# Altium schematic symbol library jlcpcb_2025_04_capacitors_extended_0603.schlib: 3668 symbols (part 9 of 20) (continued)
## CC0603JRNPO9BN152
designator C?  Capacitance: 1.5nF  (hidden comment: *)
Capacitor, Ceramic (MLCC), 1.5nF, ±5%, 50V, NP0, ±5%, SMD 0603; Manufacturer: YAGEO; Manufacturer Part Number: CC0603JRNPO9BN152; Package Size: 0603; JLCPCB Basic Part: No; JLCPCB Part Number: C107039; Supplier 1: LCSC; Category: Capacitors - MLCC; Supplier Part Number 1: C107039; Tolerance: ±5%; Voltage Rating: 50V; Temperature Coefficient: NP0; RoHS: Yes; ComponentLink1Description: Datasheet; ComponentLink1URL: https://wmsc.lcsc.com/wmsc/upload/file/pdf/v2/lcsc/2304140030_YAGEO-CC0603JRNPO9BN152_C107039.pdf; ComponentLink2Description: JLCPCB Part URL; ComponentLink2URL: https://jlcpcb.com/partdetail/C107039; ComponentLink3Description: LCSC Part URL; ComponentLink3URL: https://lcsc.com/product-detail/Multilayer-Ceramic-Capacitors-MLCC---SMD-SMT_YAGEO-YAGEO-CC0603JRNPO9BN152_C107039.html
footprint CAP-0603 (0603 (1608M) Capacitor)
pins: 1, 2

## CC0603JRNPO9BN160
designator C?  Capacitance: 16pF  (hidden comment: *)
Capacitor, Ceramic (MLCC), 16pF, ±5%, 50V, NP0, ±5%, SMD 0603; Manufacturer: YAGEO; Manufacturer Part Number: CC0603JRNPO9BN160; Package Size: 0603; JLCPCB Basic Part: No; JLCPCB Part Number: C327125; Supplier 1: LCSC; Category: Capacitors - MLCC; Supplier Part Number 1: C327125; Tolerance: ±5%; Voltage Rating: 50V; Temperature Coefficient: NP0; RoHS: Yes; ComponentLink1Description: Datasheet; ComponentLink1URL: https://wmsc.lcsc.com/wmsc/upload/file/pdf/v2/lcsc/1811141233_YAGEO-CC0603JRNPO9BN160_C327125.pdf; ComponentLink2Description: JLCPCB Part URL; ComponentLink2URL: https://jlcpcb.com/partdetail/C327125; ComponentLink3Description: LCSC Part URL; ComponentLink3URL: https://lcsc.com/product-detail/Multilayer-Ceramic-Capacitors-MLCC---SMD-SMT_YAGEO-YAGEO-CC0603JRNPO9BN160_C327125.html
footprint CAP-0603 (0603 (1608M) Capacitor)
pins: 1, 2

## CC0603JRNPO9BN161
designator C?  Capacitance: 160pF  (hidden comment: *)
Capacitor, Ceramic (MLCC), 160pF, ±5%, 50V, NP0, ±5%, SMD 0603; Manufacturer: YAGEO; Manufacturer Part Number: CC0603JRNPO9BN161; Package Size: 0603; JLCPCB Basic Part: No; JLCPCB Part Number: C327274; Supplier 1: LCSC; Category: Capacitors - MLCC; Supplier Part Number 1: C327274; Tolerance: ±5%; Voltage Rating: 50V; Temperature Coefficient: NP0; RoHS: Yes; ComponentLink1Description: Datasheet; ComponentLink1URL: https://wmsc.lcsc.com/wmsc/upload/file/pdf/v2/lcsc/2304140030_YAGEO-CC0603JRNPO9BN161_C327274.pdf; ComponentLink2Description: JLCPCB Part URL; ComponentLink2URL: https://jlcpcb.com/partdetail/C327274; ComponentLink3Description: LCSC Part URL; ComponentLink3URL: https://lcsc.com/product-detail/Multilayer-Ceramic-Capacitors-MLCC---SMD-SMT_YAGEO-YAGEO-CC0603JRNPO9BN161_C327274.html
footprint CAP-0603 (0603 (1608M) Capacitor)
pins: 1, 2

## CC0603JRNPO9BN180
designator C?  Capacitance: 18pF  (hidden comment: *)
Capacitor, Ceramic (MLCC), 18pF, ±5%, 50V, NP0, ±5%, SMD 0603; Manufacturer: YAGEO; Manufacturer Part Number: CC0603JRNPO9BN180; Package Size: 0603; JLCPCB Basic Part: No; JLCPCB Part Number: C107040; Supplier 1: LCSC; Category: Capacitors - MLCC; Supplier Part Number 1: C107040; Tolerance: ±5%; Voltage Rating: 50V; Temperature Coefficient: NP0; RoHS: Yes; ComponentLink1Description: Datasheet; ComponentLink1URL: https://wmsc.lcsc.com/wmsc/upload/file/pdf/v2/lcsc/2304140030_YAGEO-CC0603JRNPO9BN180_C107040.pdf; ComponentLink2Description: JLCPCB Part URL; ComponentLink2URL: https://jlcpcb.com/partdetail/C107040; ComponentLink3Description: LCSC Part URL; ComponentLink3URL: https://lcsc.com/product-detail/Multilayer-Ceramic-Capacitors-MLCC---SMD-SMT_YAGEO-YAGEO-CC0603JRNPO9BN180_C107040.html
footprint CAP-0603 (0603 (1608M) Capacitor)
pins: 1, 2

## CC0603JRNPO9BN181
designator C?  Capacitance: 180pF  (hidden comment: *)
Capacitor, Ceramic (MLCC), 180pF, ±5%, 50V, NP0, ±5%, SMD 0603; Manufacturer: YAGEO; Manufacturer Part Number: CC0603JRNPO9BN181; Package Size: 0603; JLCPCB Basic Part: No; JLCPCB Part Number: C107041; Supplier 1: LCSC; Category: Capacitors - MLCC; Supplier Part Number 1: C107041; Tolerance: ±5%; Voltage Rating: 50V; Temperature Coefficient: NP0; RoHS: Yes; ComponentLink1Description: Datasheet; ComponentLink1URL: https://wmsc.lcsc.com/wmsc/upload/file/pdf/v2/lcsc/2304140030_YAGEO-CC0603JRNPO9BN181_C107041.pdf; ComponentLink2Description: JLCPCB Part URL; ComponentLink2URL: https://jlcpcb.com/partdetail/C107041; ComponentLink3Description: LCSC Part URL; ComponentLink3URL: https://lcsc.com/product-detail/Multilayer-Ceramic-Capacitors-MLCC---SMD-SMT_YAGEO-YAGEO-CC0603JRNPO9BN181_C107041.html
footprint CAP-0603 (0603 (1608M) Capacitor)
pins: 1, 2

## CC0603JRNPO9BN182
designator C?  Capacitance: 1.8nF  (hidden comment: *)
Capacitor, Ceramic (MLCC), 1.8nF, ±5%, 50V, NP0, ±5%, SMD 0603; Manufacturer: YAGEO; Manufacturer Part Number: CC0603JRNPO9BN182; Package Size: 0603; JLCPCB Basic Part: No; JLCPCB Part Number: C107042; Supplier 1: LCSC; Category: Capacitors - MLCC; Supplier Part Number 1: C107042; Tolerance: ±5%; Voltage Rating: 50V; Temperature Coefficient: NP0; RoHS: Yes; ComponentLink1Description: Datasheet; ComponentLink1URL: https://wmsc.lcsc.com/wmsc/upload/file/pdf/v2/lcsc/2304140030_YAGEO-CC0603JRNPO9BN182_C107042.pdf; ComponentLink2Description: JLCPCB Part URL; ComponentLink2URL: https://jlcpcb.com/partdetail/C107042; ComponentLink3Description: LCSC Part URL; ComponentLink3URL: https://lcsc.com/product-detail/Multilayer-Ceramic-Capacitors-MLCC---SMD-SMT_YAGEO-YAGEO-CC0603JRNPO9BN182_C107042.html
footprint CAP-0603 (0603 (1608M) Capacitor)
pins: 1, 2

## CC0603JRNPO9BN200
designator C?  Capacitance: 20pF  (hidden comment: *)
Capacitor, Ceramic (MLCC), 20pF, ±5%, 50V, NP0, ±5%, SMD 0603; Manufacturer: YAGEO; Manufacturer Part Number: CC0603JRNPO9BN200; Package Size: 0603; JLCPCB Basic Part: No; JLCPCB Part Number: C105621; Supplier 1: LCSC; Category: Capacitors - MLCC; Supplier Part Number 1: C105621; Tolerance: ±5%; Voltage Rating: 50V; Temperature Coefficient: NP0; RoHS: Yes; ComponentLink1Description: Datasheet; ComponentLink1URL: https://wmsc.lcsc.com/wmsc/upload/file/pdf/v2/lcsc/2304140030_YAGEO-CC0603JRNPO9BN200_C105621.pdf; ComponentLink2Description: JLCPCB Part URL; ComponentLink2URL: https://jlcpcb.com/partdetail/C105621; ComponentLink3Description: LCSC Part URL; ComponentLink3URL: https://lcsc.com/product-detail/Multilayer-Ceramic-Capacitors-MLCC---SMD-SMT_YAGEO-YAGEO-CC0603JRNPO9BN200_C105621.html
footprint CAP-0603 (0603 (1608M) Capacitor)
pins: 1, 2

## CC0603JRNPO9BN201
designator C?  Capacitance: 200pF  (hidden comment: *)
Capacitor, Ceramic (MLCC), 200pF, ±5%, 50V, NP0, ±5%, SMD 0603; Manufacturer: YAGEO; Manufacturer Part Number: CC0603JRNPO9BN201; Package Size: 0603; JLCPCB Basic Part: No; JLCPCB Part Number: C113796; Supplier 1: LCSC; Category: Capacitors - MLCC; Supplier Part Number 1: C113796; Tolerance: ±5%; Voltage Rating: 50V; Temperature Coefficient: NP0; RoHS: Yes; ComponentLink1Description: Datasheet; ComponentLink1URL: https://wmsc.lcsc.com/wmsc/upload/file/pdf/v2/lcsc/2304140030_YAGEO-CC0603JRNPO9BN201_C113796.pdf; ComponentLink2Description: JLCPCB Part URL; ComponentLink2URL: https://jlcpcb.com/partdetail/C113796; ComponentLink3Description: LCSC Part URL; ComponentLink3URL: https://lcsc.com/product-detail/Multilayer-Ceramic-Capacitors-MLCC---SMD-SMT_YAGEO-YAGEO-CC0603JRNPO9BN201_C113796.html
footprint CAP-0603 (0603 (1608M) Capacitor)
pins: 1, 2

## CC0603JRNPO9BN220
designator C?  Capacitance: 22pF  (hidden comment: *)
Capacitor, Ceramic (MLCC), 22pF, ±5%, 50V, NP0, ±5%, SMD 0603; Manufacturer: YAGEO; Manufacturer Part Number: CC0603JRNPO9BN220; Package Size: 0603; JLCPCB Basic Part: No; JLCPCB Part Number: C105620; Supplier 1: LCSC; Category: Capacitors - MLCC; Supplier Part Number 1: C105620; Tolerance: ±5%; Voltage Rating: 50V; Temperature Coefficient: NP0; RoHS: Yes; ComponentLink1Description: Datasheet; ComponentLink1URL: https://wmsc.lcsc.com/wmsc/upload/file/pdf/v2/lcsc/2304140030_YAGEO-CC0603JRNPO9BN220_C105620.pdf; ComponentLink2Description: JLCPCB Part URL; ComponentLink2URL: https://jlcpcb.com/partdetail/C105620; ComponentLink3Description: LCSC Part URL; ComponentLink3URL: https://lcsc.com/product-detail/Multilayer-Ceramic-Capacitors-MLCC---SMD-SMT_YAGEO-YAGEO-CC0603JRNPO9BN220_C105620.html
footprint CAP-0603 (0603 (1608M) Capacitor)
pins: 1, 2

## CC0603JRNPO9BN221
designator C?  Capacitance: 220pF  (hidden comment: *)
Capacitor, Ceramic (MLCC), 220pF, ±5%, 50V, NP0, ±5%, SMD 0603; Manufacturer: YAGEO; Manufacturer Part Number: CC0603JRNPO9BN221; Package Size: 0603; JLCPCB Basic Part: No; JLCPCB Part Number: C106210; Supplier 1: LCSC; Category: Capacitors - MLCC; Supplier Part Number 1: C106210; Tolerance: ±5%; Voltage Rating: 50V; Temperature Coefficient: NP0; RoHS: Yes; ComponentLink1Description: Datasheet; ComponentLink1URL: https://wmsc.lcsc.com/wmsc/upload/file/pdf/v2/lcsc/2304140030_YAGEO-CC0603JRNPO9BN221_C106210.pdf; ComponentLink2Description: JLCPCB Part URL; ComponentLink2URL: https://jlcpcb.com/partdetail/C106210; ComponentLink3Description: LCSC Part URL; ComponentLink3URL: https://lcsc.com/product-detail/Multilayer-Ceramic-Capacitors-MLCC---SMD-SMT_YAGEO-YAGEO-CC0603JRNPO9BN221_C106210.html
footprint CAP-0603 (0603 (1608M) Capacitor)
pins: 1, 2

## CC0603JRNPO9BN222
designator C?  Capacitance: 2.2nF  (hidden comment: *)
Capacitor, Ceramic (MLCC), 2.2nF, ±5%, 50V, NP0, ±5%, SMD 0603; Manufacturer: YAGEO; Manufacturer Part Number: CC0603JRNPO9BN222; Package Size: 0603; JLCPCB Basic Part: No; JLCPCB Part Number: C107043; Supplier 1: LCSC; Category: Capacitors - MLCC; Supplier Part Number 1: C107043; Tolerance: ±5%; Voltage Rating: 50V; Temperature Coefficient: NP0; RoHS: Yes; ComponentLink1Description: Datasheet; ComponentLink1URL: https://wmsc.lcsc.com/wmsc/upload/file/pdf/v2/lcsc/2304140030_YAGEO-CC0603JRNPO9BN222_C107043.pdf; ComponentLink2Description: JLCPCB Part URL; ComponentLink2URL: https://jlcpcb.com/partdetail/C107043; ComponentLink3Description: LCSC Part URL; ComponentLink3URL: https://lcsc.com/product-detail/Multilayer-Ceramic-Capacitors-MLCC---SMD-SMT_YAGEO-YAGEO-CC0603JRNPO9BN222_C107043.html
footprint CAP-0603 (0603 (1608M) Capacitor)
pins: 1, 2

## CC0603JRNPO9BN240
designator C?  Capacitance: 24pF  (hidden comment: *)
Capacitor, Ceramic (MLCC), 24pF, ±5%, 50V, NP0, ±5%, SMD 0603; Manufacturer: YAGEO; Manufacturer Part Number: CC0603JRNPO9BN240; Package Size: 0603; JLCPCB Basic Part: No; JLCPCB Part Number: C107044; Supplier 1: LCSC; Category: Capacitors - MLCC; Supplier Part Number 1: C107044; Tolerance: ±5%; Voltage Rating: 50V; Temperature Coefficient: NP0; RoHS: Yes; ComponentLink1Description: Datasheet; ComponentLink1URL: https://wmsc.lcsc.com/wmsc/upload/file/pdf/v2/lcsc/2304140030_YAGEO-CC0603JRNPO9BN240_C107044.pdf; ComponentLink2Description: JLCPCB Part URL; ComponentLink2URL: https://jlcpcb.com/partdetail/C107044; ComponentLink3Description: LCSC Part URL; ComponentLink3URL: https://lcsc.com/product-detail/Multilayer-Ceramic-Capacitors-MLCC---SMD-SMT_YAGEO-YAGEO-CC0603JRNPO9BN240_C107044.html
footprint CAP-0603 (0603 (1608M) Capacitor)
pins: 1, 2

## CC0603JRNPO9BN241
designator C?  Capacitance: 240pF  (hidden comment: *)
Capacitor, Ceramic (MLCC), 240pF, ±5%, 50V, NP0, ±5%, SMD 0603; Manufacturer: YAGEO; Manufacturer Part Number: CC0603JRNPO9BN241; Package Size: 0603; JLCPCB Basic Part: No; JLCPCB Part Number: C519400; Supplier 1: LCSC; Category: Capacitors - MLCC; Supplier Part Number 1: C519400; Tolerance: ±5%; Voltage Rating: 50V; Temperature Coefficient: NP0; RoHS: Yes; ComponentLink1Description: Datasheet; ComponentLink1URL: https://wmsc.lcsc.com/wmsc/upload/file/pdf/v2/lcsc/2005181834_YAGEO-CC0603JRNPO9BN241_C519400.pdf; ComponentLink2Description: JLCPCB Part URL; ComponentLink2URL: https://jlcpcb.com/partdetail/C519400; ComponentLink3Description: LCSC Part URL; ComponentLink3URL: https://lcsc.com/product-detail/Multilayer-Ceramic-Capacitors-MLCC---SMD-SMT_YAGEO-YAGEO-CC0603JRNPO9BN241_C519400.html
footprint CAP-0603 (0603 (1608M) Capacitor)
pins: 1, 2

## CC0603JRNPO9BN250
designator C?  Capacitance: 25pF  (hidden comment: *)
Capacitor, Ceramic (MLCC), 25pF, ±5%, 50V, NP0, ±5%, SMD 0603; Manufacturer: YAGEO; Manufacturer Part Number: CC0603JRNPO9BN250; Package Size: 0603; JLCPCB Basic Part: No; JLCPCB Part Number: C282067; Supplier 1: LCSC; Category: Capacitors - MLCC; Supplier Part Number 1: C282067; Tolerance: ±5%; Voltage Rating: 50V; Temperature Coefficient: NP0; RoHS: Yes; ComponentLink1Description: Datasheet; ComponentLink1URL: https://wmsc.lcsc.com/wmsc/upload/file/pdf/v2/lcsc/2304140030_YAGEO-CC0603JRNPO9BN250_C282067.pdf; ComponentLink2Description: JLCPCB Part URL; ComponentLink2URL: https://jlcpcb.com/partdetail/C282067; ComponentLink3Description: LCSC Part URL; ComponentLink3URL: https://lcsc.com/product-detail/Multilayer-Ceramic-Capacitors-MLCC---SMD-SMT_YAGEO-YAGEO-CC0603JRNPO9BN250_C282067.html
footprint CAP-0603 (0603 (1608M) Capacitor)
pins: 1, 2

## CC0603JRNPO9BN270
designator C?  Capacitance: 27pF  (hidden comment: *)
Capacitor, Ceramic (MLCC), 27pF, ±5%, 50V, NP0, ±5%, SMD 0603; Manufacturer: YAGEO; Manufacturer Part Number: CC0603JRNPO9BN270; Package Size: 0603; JLCPCB Basic Part: No; JLCPCB Part Number: C107045; Supplier 1: LCSC; Category: Capacitors - MLCC; Supplier Part Number 1: C107045; Tolerance: ±5%; Voltage Rating: 50V; Temperature Coefficient: NP0; RoHS: Yes; ComponentLink1Description: Datasheet; ComponentLink1URL: https://wmsc.lcsc.com/wmsc/upload/file/pdf/v2/lcsc/2304140030_YAGEO-CC0603JRNPO9BN270_C107045.pdf; ComponentLink2Description: JLCPCB Part URL; ComponentLink2URL: https://jlcpcb.com/partdetail/C107045; ComponentLink3Description: LCSC Part URL; ComponentLink3URL: https://lcsc.com/product-detail/Multilayer-Ceramic-Capacitors-MLCC---SMD-SMT_YAGEO-YAGEO-CC0603JRNPO9BN270_C107045.html
footprint CAP-0603 (0603 (1608M) Capacitor)
pins: 1, 2

## CC0603JRNPO9BN271
designator C?  Capacitance: 270pF  (hidden comment: *)
Capacitor, Ceramic (MLCC), 270pF, ±5%, 50V, NP0, ±5%, SMD 0603; Manufacturer: YAGEO; Manufacturer Part Number: CC0603JRNPO9BN271; Package Size: 0603; JLCPCB Basic Part: No; JLCPCB Part Number: C107046; Supplier 1: LCSC; Category: Capacitors - MLCC; Supplier Part Number 1: C107046; Tolerance: ±5%; Voltage Rating: 50V; Temperature Coefficient: NP0; RoHS: Yes; ComponentLink1Description: Datasheet; ComponentLink1URL: https://wmsc.lcsc.com/wmsc/upload/file/pdf/v2/lcsc/2304140030_YAGEO-CC0603JRNPO9BN271_C107046.pdf; ComponentLink2Description: JLCPCB Part URL; ComponentLink2URL: https://jlcpcb.com/partdetail/C107046; ComponentLink3Description: LCSC Part URL; ComponentLink3URL: https://lcsc.com/product-detail/Multilayer-Ceramic-Capacitors-MLCC---SMD-SMT_YAGEO-YAGEO-CC0603JRNPO9BN271_C107046.html
footprint CAP-0603 (0603 (1608M) Capacitor)
pins: 1, 2

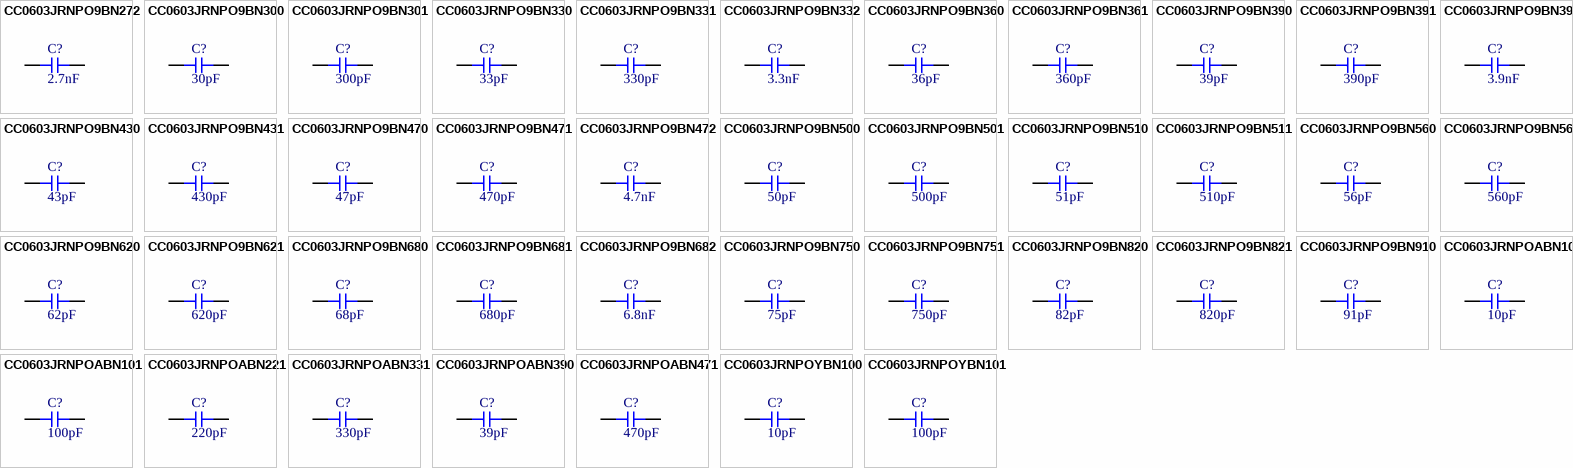
[diagram p41: symbols CC0603JRNPO9BN272 to CC0603JRNPOYBN101]

## CC0603JRNPO9BN272
designator C?  Capacitance: 2.7nF  (hidden comment: *)
Capacitor, Ceramic (MLCC), 2.7nF, ±5%, 50V, NP0, ±5%, SMD 0603; Manufacturer: YAGEO; Manufacturer Part Number: CC0603JRNPO9BN272; Package Size: 0603; JLCPCB Basic Part: No; JLCPCB Part Number: C326759; Supplier 1: LCSC; Category: Capacitors - MLCC; Supplier Part Number 1: C326759; Tolerance: ±5%; Voltage Rating: 50V; Temperature Coefficient: NP0; RoHS: Yes; ComponentLink1Description: Datasheet; ComponentLink1URL: https://wmsc.lcsc.com/wmsc/upload/file/pdf/v2/lcsc/1811151646_YAGEO-CC0603JRNPO9BN272_C326759.pdf; ComponentLink2Description: JLCPCB Part URL; ComponentLink2URL: https://jlcpcb.com/partdetail/C326759; ComponentLink3Description: LCSC Part URL; ComponentLink3URL: https://lcsc.com/product-detail/Multilayer-Ceramic-Capacitors-MLCC---SMD-SMT_YAGEO-YAGEO-CC0603JRNPO9BN272_C326759.html
footprint CAP-0603 (0603 (1608M) Capacitor)
pins: 1, 2

## CC0603JRNPO9BN300
designator C?  Capacitance: 30pF  (hidden comment: *)
Capacitor, Ceramic (MLCC), 30pF, ±5%, 50V, NP0, ±5%, SMD 0603; Manufacturer: YAGEO; Manufacturer Part Number: CC0603JRNPO9BN300; Package Size: 0603; JLCPCB Basic Part: No; JLCPCB Part Number: C113797; Supplier 1: LCSC; Category: Capacitors - MLCC; Supplier Part Number 1: C113797; Tolerance: ±5%; Voltage Rating: 50V; Temperature Coefficient: NP0; RoHS: Yes; ComponentLink1Description: Datasheet; ComponentLink1URL: https://wmsc.lcsc.com/wmsc/upload/file/pdf/v2/lcsc/2304140030_YAGEO-CC0603JRNPO9BN300_C113797.pdf; ComponentLink2Description: JLCPCB Part URL; ComponentLink2URL: https://jlcpcb.com/partdetail/C113797; ComponentLink3Description: LCSC Part URL; ComponentLink3URL: https://lcsc.com/product-detail/Multilayer-Ceramic-Capacitors-MLCC---SMD-SMT_YAGEO-YAGEO-CC0603JRNPO9BN300_C113797.html
footprint CAP-0603 (0603 (1608M) Capacitor)
pins: 1, 2

## CC0603JRNPO9BN301
designator C?  Capacitance: 300pF  (hidden comment: *)
Capacitor, Ceramic (MLCC), 300pF, ±5%, 50V, NP0, ±5%, SMD 0603; Manufacturer: YAGEO; Manufacturer Part Number: CC0603JRNPO9BN301; Package Size: 0603; JLCPCB Basic Part: No; JLCPCB Part Number: C519401; Supplier 1: LCSC; Category: Capacitors - MLCC; Supplier Part Number 1: C519401; Tolerance: ±5%; Voltage Rating: 50V; Temperature Coefficient: NP0; RoHS: Yes; ComponentLink1Description: Datasheet; ComponentLink1URL: https://wmsc.lcsc.com/wmsc/upload/file/pdf/v2/lcsc/2005141203_YAGEO-CC0603JRNPO9BN301_C519401.pdf; ComponentLink2Description: JLCPCB Part URL; ComponentLink2URL: https://jlcpcb.com/partdetail/C519401; ComponentLink3Description: LCSC Part URL; ComponentLink3URL: https://lcsc.com/product-detail/Multilayer-Ceramic-Capacitors-MLCC---SMD-SMT_YAGEO-YAGEO-CC0603JRNPO9BN301_C519401.html
footprint CAP-0603 (0603 (1608M) Capacitor)
pins: 1, 2

## CC0603JRNPO9BN330
designator C?  Capacitance: 33pF  (hidden comment: *)
Capacitor, Ceramic (MLCC), 33pF, ±5%, 50V, NP0, ±5%, SMD 0603; Manufacturer: YAGEO; Manufacturer Part Number: CC0603JRNPO9BN330; Package Size: 0603; JLCPCB Basic Part: No; JLCPCB Part Number: C107047; Supplier 1: LCSC; Category: Capacitors - MLCC; Supplier Part Number 1: C107047; Tolerance: ±5%; Voltage Rating: 50V; Temperature Coefficient: NP0; RoHS: Yes; ComponentLink1Description: Datasheet; ComponentLink1URL: https://wmsc.lcsc.com/wmsc/upload/file/pdf/v2/lcsc/2304140030_YAGEO-CC0603JRNPO9BN330_C107047.pdf; ComponentLink2Description: JLCPCB Part URL; ComponentLink2URL: https://jlcpcb.com/partdetail/C107047; ComponentLink3Description: LCSC Part URL; ComponentLink3URL: https://lcsc.com/product-detail/Multilayer-Ceramic-Capacitors-MLCC---SMD-SMT_YAGEO-YAGEO-CC0603JRNPO9BN330_C107047.html
footprint CAP-0603 (0603 (1608M) Capacitor)
pins: 1, 2

## CC0603JRNPO9BN331
designator C?  Capacitance: 330pF  (hidden comment: *)
Capacitor, Ceramic (MLCC), 330pF, ±5%, 50V, NP0, ±5%, SMD 0603; Manufacturer: YAGEO; Manufacturer Part Number: CC0603JRNPO9BN331; Package Size: 0603; JLCPCB Basic Part: No; JLCPCB Part Number: C62784; Supplier 1: LCSC; Category: Capacitors - MLCC; Supplier Part Number 1: C62784; Tolerance: ±5%; Voltage Rating: 50V; Temperature Coefficient: NP0; RoHS: Yes; ComponentLink1Description: Datasheet; ComponentLink1URL: https://wmsc.lcsc.com/wmsc/upload/file/pdf/v2/lcsc/2304140030_YAGEO-CC0603JRNPO9BN331_C62784.pdf; ComponentLink2Description: JLCPCB Part URL; ComponentLink2URL: https://jlcpcb.com/partdetail/C62784; ComponentLink3Description: LCSC Part URL; ComponentLink3URL: https://lcsc.com/product-detail/Multilayer-Ceramic-Capacitors-MLCC---SMD-SMT_YAGEO-YAGEO-CC0603JRNPO9BN331_C62784.html
footprint CAP-0603 (0603 (1608M) Capacitor)
pins: 1, 2

## CC0603JRNPO9BN332
designator C?  Capacitance: 3.3nF  (hidden comment: *)
Capacitor, Ceramic (MLCC), 3.3nF, ±5%, 50V, NP0, ±5%, SMD 0603; Manufacturer: YAGEO; Manufacturer Part Number: CC0603JRNPO9BN332; Package Size: 0603; JLCPCB Basic Part: No; JLCPCB Part Number: C107048; Supplier 1: LCSC; Category: Capacitors - MLCC; Supplier Part Number 1: C107048; Tolerance: ±5%; Voltage Rating: 50V; Temperature Coefficient: NP0; RoHS: Yes; ComponentLink1Description: Datasheet; ComponentLink1URL: https://wmsc.lcsc.com/wmsc/upload/file/pdf/v2/lcsc/2304140030_YAGEO-CC0603JRNPO9BN332_C107048.pdf; ComponentLink2Description: JLCPCB Part URL; ComponentLink2URL: https://jlcpcb.com/partdetail/C107048; ComponentLink3Description: LCSC Part URL; ComponentLink3URL: https://lcsc.com/product-detail/Multilayer-Ceramic-Capacitors-MLCC---SMD-SMT_YAGEO-YAGEO-CC0603JRNPO9BN332_C107048.html
footprint CAP-0603 (0603 (1608M) Capacitor)
pins: 1, 2

## CC0603JRNPO9BN360
designator C?  Capacitance: 36pF  (hidden comment: *)
Capacitor, Ceramic (MLCC), 36pF, ±5%, 50V, NP0, ±5%, SMD 0603; Manufacturer: YAGEO; Manufacturer Part Number: CC0603JRNPO9BN360; Package Size: 0603; JLCPCB Basic Part: No; JLCPCB Part Number: C134070; Supplier 1: LCSC; Category: Capacitors - MLCC; Supplier Part Number 1: C134070; Tolerance: ±5%; Voltage Rating: 50V; Temperature Coefficient: NP0; RoHS: Yes; ComponentLink1Description: Datasheet; ComponentLink1URL: https://wmsc.lcsc.com/wmsc/upload/file/pdf/v2/lcsc/2304140030_YAGEO-CC0603JRNPO9BN360_C134070.pdf; ComponentLink2Description: JLCPCB Part URL; ComponentLink2URL: https://jlcpcb.com/partdetail/C134070; ComponentLink3Description: LCSC Part URL; ComponentLink3URL: https://lcsc.com/product-detail/Multilayer-Ceramic-Capacitors-MLCC---SMD-SMT_YAGEO-YAGEO-CC0603JRNPO9BN360_C134070.html
footprint CAP-0603 (0603 (1608M) Capacitor)
pins: 1, 2

## CC0603JRNPO9BN361
designator C?  Capacitance: 360pF  (hidden comment: *)
Capacitor, Ceramic (MLCC), 360pF, ±5%, 50V, NP0, ±5%, SMD 0603; Manufacturer: YAGEO; Manufacturer Part Number: CC0603JRNPO9BN361; Package Size: 0603; JLCPCB Basic Part: No; JLCPCB Part Number: C513587; Supplier 1: LCSC; Category: Capacitors - MLCC; Supplier Part Number 1: C513587; Tolerance: ±5%; Voltage Rating: 50V; Temperature Coefficient: NP0; RoHS: Yes; ComponentLink1Description: Datasheet; ComponentLink1URL: https://wmsc.lcsc.com/wmsc/upload/file/pdf/v2/lcsc/2007201009_YAGEO-CC0603JRNPO9BN361_C513587.pdf; ComponentLink2Description: JLCPCB Part URL; ComponentLink2URL: https://jlcpcb.com/partdetail/C513587; ComponentLink3Description: LCSC Part URL; ComponentLink3URL: https://lcsc.com/product-detail/Multilayer-Ceramic-Capacitors-MLCC---SMD-SMT_YAGEO-YAGEO-CC0603JRNPO9BN361_C513587.html
footprint CAP-0603 (0603 (1608M) Capacitor)
pins: 1, 2

## CC0603JRNPO9BN390
designator C?  Capacitance: 39pF  (hidden comment: *)
Capacitor, Ceramic (MLCC), 39pF, ±5%, 50V, NP0, ±5%, SMD 0603; Manufacturer: YAGEO; Manufacturer Part Number: CC0603JRNPO9BN390; Package Size: 0603; JLCPCB Basic Part: No; JLCPCB Part Number: C107049; Supplier 1: LCSC; Category: Capacitors - MLCC; Supplier Part Number 1: C107049; Tolerance: ±5%; Voltage Rating: 50V; Temperature Coefficient: NP0; RoHS: Yes; ComponentLink1Description: Datasheet; ComponentLink1URL: https://wmsc.lcsc.com/wmsc/upload/file/pdf/v2/lcsc/2304140030_YAGEO-CC0603JRNPO9BN390_C107049.pdf; ComponentLink2Description: JLCPCB Part URL; ComponentLink2URL: https://jlcpcb.com/partdetail/C107049; ComponentLink3Description: LCSC Part URL; ComponentLink3URL: https://lcsc.com/product-detail/Multilayer-Ceramic-Capacitors-MLCC---SMD-SMT_YAGEO-YAGEO-CC0603JRNPO9BN390_C107049.html
footprint CAP-0603 (0603 (1608M) Capacitor)
pins: 1, 2

## CC0603JRNPO9BN391
designator C?  Capacitance: 390pF  (hidden comment: *)
Capacitor, Ceramic (MLCC), 390pF, ±5%, 50V, NP0, ±5%, SMD 0603; Manufacturer: YAGEO; Manufacturer Part Number: CC0603JRNPO9BN391; Package Size: 0603; JLCPCB Basic Part: No; JLCPCB Part Number: C107050; Supplier 1: LCSC; Category: Capacitors - MLCC; Supplier Part Number 1: C107050; Tolerance: ±5%; Voltage Rating: 50V; Temperature Coefficient: NP0; RoHS: Yes; ComponentLink1Description: Datasheet; ComponentLink1URL: https://wmsc.lcsc.com/wmsc/upload/file/pdf/v2/lcsc/2304140030_YAGEO-CC0603JRNPO9BN391_C107050.pdf; ComponentLink2Description: JLCPCB Part URL; ComponentLink2URL: https://jlcpcb.com/partdetail/C107050; ComponentLink3Description: LCSC Part URL; ComponentLink3URL: https://lcsc.com/product-detail/Multilayer-Ceramic-Capacitors-MLCC---SMD-SMT_YAGEO-YAGEO-CC0603JRNPO9BN391_C107050.html
footprint CAP-0603 (0603 (1608M) Capacitor)
pins: 1, 2

## CC0603JRNPO9BN392
designator C?  Capacitance: 3.9nF  (hidden comment: *)
Capacitor, Ceramic (MLCC), 3.9nF, ±5%, 50V, NP0, ±5%, SMD 0603; Manufacturer: YAGEO; Manufacturer Part Number: CC0603JRNPO9BN392; Package Size: 0603; JLCPCB Basic Part: No; JLCPCB Part Number: C576817; Supplier 1: LCSC; Category: Capacitors - MLCC; Supplier Part Number 1: C576817; Tolerance: ±5%; Voltage Rating: 50V; Temperature Coefficient: NP0; RoHS: Yes; ComponentLink1Description: Datasheet; ComponentLink1URL: https://wmsc.lcsc.com/wmsc/upload/file/pdf/v2/lcsc/2204291600_YAGEO-CC0603JRNPO9BN392_C576817.pdf; ComponentLink2Description: JLCPCB Part URL; ComponentLink2URL: https://jlcpcb.com/partdetail/C576817; ComponentLink3Description: LCSC Part URL; ComponentLink3URL: https://lcsc.com/product-detail/Multilayer-Ceramic-Capacitors-MLCC---SMD-SMT_YAGEO-YAGEO-CC0603JRNPO9BN392_C576817.html
footprint CAP-0603 (0603 (1608M) Capacitor)
pins: 1, 2

## CC0603JRNPO9BN430
designator C?  Capacitance: 43pF  (hidden comment: *)
Capacitor, Ceramic (MLCC), 43pF, ±5%, 50V, NP0, ±5%, SMD 0603; Manufacturer: YAGEO; Manufacturer Part Number: CC0603JRNPO9BN430; Package Size: 0603; JLCPCB Basic Part: No; JLCPCB Part Number: C282069; Supplier 1: LCSC; Category: Capacitors - MLCC; Supplier Part Number 1: C282069; Tolerance: ±5%; Voltage Rating: 50V; Temperature Coefficient: NP0; RoHS: Yes; ComponentLink1Description: Datasheet; ComponentLink1URL: https://wmsc.lcsc.com/wmsc/upload/file/pdf/v2/lcsc/2304140030_YAGEO-CC0603JRNPO9BN430_C282069.pdf; ComponentLink2Description: JLCPCB Part URL; ComponentLink2URL: https://jlcpcb.com/partdetail/C282069; ComponentLink3Description: LCSC Part URL; ComponentLink3URL: https://lcsc.com/product-detail/Multilayer-Ceramic-Capacitors-MLCC---SMD-SMT_YAGEO-YAGEO-CC0603JRNPO9BN430_C282069.html
footprint CAP-0603 (0603 (1608M) Capacitor)
pins: 1, 2

## CC0603JRNPO9BN431
designator C?  Capacitance: 430pF  (hidden comment: *)
Capacitor, Ceramic (MLCC), 430pF, ±5%, 50V, NP0, ±5%, SMD 0603; Manufacturer: YAGEO; Manufacturer Part Number: CC0603JRNPO9BN431; Package Size: 0603; JLCPCB Basic Part: No; JLCPCB Part Number: C309472; Supplier 1: LCSC; Category: Capacitors - MLCC; Supplier Part Number 1: C309472; Tolerance: ±5%; Voltage Rating: 50V; Temperature Coefficient: NP0; RoHS: Yes; ComponentLink1Description: Datasheet; ComponentLink1URL: https://wmsc.lcsc.com/wmsc/upload/file/pdf/v2/lcsc/2304140030_YAGEO-CC0603JRNPO9BN431_C309472.pdf; ComponentLink2Description: JLCPCB Part URL; ComponentLink2URL: https://jlcpcb.com/partdetail/C309472; ComponentLink3Description: LCSC Part URL; ComponentLink3URL: https://lcsc.com/product-detail/Multilayer-Ceramic-Capacitors-MLCC---SMD-SMT_YAGEO-YAGEO-CC0603JRNPO9BN431_C309472.html
footprint CAP-0603 (0603 (1608M) Capacitor)
pins: 1, 2

## CC0603JRNPO9BN470
designator C?  Capacitance: 47pF  (hidden comment: *)
Capacitor, Ceramic (MLCC), 47pF, ±5%, 50V, NP0, ±5%, SMD 0603; Manufacturer: YAGEO; Manufacturer Part Number: CC0603JRNPO9BN470; Package Size: 0603; JLCPCB Basic Part: No; JLCPCB Part Number: C105622; Supplier 1: LCSC; Category: Capacitors - MLCC; Supplier Part Number 1: C105622; Tolerance: ±5%; Voltage Rating: 50V; Temperature Coefficient: NP0; RoHS: Yes; ComponentLink1Description: Datasheet; ComponentLink1URL: https://wmsc.lcsc.com/wmsc/upload/file/pdf/v2/lcsc/2304140030_YAGEO-CC0603JRNPO9BN470_C105622.pdf; ComponentLink2Description: JLCPCB Part URL; ComponentLink2URL: https://jlcpcb.com/partdetail/C105622; ComponentLink3Description: LCSC Part URL; ComponentLink3URL: https://lcsc.com/product-detail/Multilayer-Ceramic-Capacitors-MLCC---SMD-SMT_YAGEO-YAGEO-CC0603JRNPO9BN470_C105622.html
footprint CAP-0603 (0603 (1608M) Capacitor)
pins: 1, 2

## CC0603JRNPO9BN471
designator C?  Capacitance: 470pF  (hidden comment: *)
Capacitor, Ceramic (MLCC), 470pF, ±5%, 50V, NP0, ±5%, SMD 0603; Manufacturer: YAGEO; Manufacturer Part Number: CC0603JRNPO9BN471; Package Size: 0603; JLCPCB Basic Part: No; JLCPCB Part Number: C106211; Supplier 1: LCSC; Category: Capacitors - MLCC; Supplier Part Number 1: C106211; Tolerance: ±5%; Voltage Rating: 50V; Temperature Coefficient: NP0; RoHS: Yes; ComponentLink1Description: Datasheet; ComponentLink1URL: https://wmsc.lcsc.com/wmsc/upload/file/pdf/v2/lcsc/2304140030_YAGEO-CC0603JRNPO9BN471_C106211.pdf; ComponentLink2Description: JLCPCB Part URL; ComponentLink2URL: https://jlcpcb.com/partdetail/C106211; ComponentLink3Description: LCSC Part URL; ComponentLink3URL: https://lcsc.com/product-detail/Multilayer-Ceramic-Capacitors-MLCC---SMD-SMT_YAGEO-YAGEO-CC0603JRNPO9BN471_C106211.html
footprint CAP-0603 (0603 (1608M) Capacitor)
pins: 1, 2

## CC0603JRNPO9BN472
designator C?  Capacitance: 4.7nF  (hidden comment: *)
Capacitor, Ceramic (MLCC), 4.7nF, ±5%, 50V, NP0, ±5%, SMD 0603; Manufacturer: YAGEO; Manufacturer Part Number: CC0603JRNPO9BN472; Package Size: 0603; JLCPCB Basic Part: No; JLCPCB Part Number: C576818; Supplier 1: LCSC; Category: Capacitors - MLCC; Supplier Part Number 1: C576818; Tolerance: ±5%; Voltage Rating: 50V; Temperature Coefficient: NP0; RoHS: Yes; ComponentLink1Description: Datasheet; ComponentLink1URL: https://wmsc.lcsc.com/wmsc/upload/file/pdf/v2/lcsc/2304140030_YAGEO-CC0603JRNPO9BN472_C576818.pdf; ComponentLink2Description: JLCPCB Part URL; ComponentLink2URL: https://jlcpcb.com/partdetail/C576818; ComponentLink3Description: LCSC Part URL; ComponentLink3URL: https://lcsc.com/product-detail/Multilayer-Ceramic-Capacitors-MLCC---SMD-SMT_YAGEO-YAGEO-CC0603JRNPO9BN472_C576818.html
footprint CAP-0603 (0603 (1608M) Capacitor)
pins: 1, 2

## CC0603JRNPO9BN500
designator C?  Capacitance: 50pF  (hidden comment: *)
Capacitor, Ceramic (MLCC), 50pF, ±5%, 50V, NP0, ±5%, SMD 0603; Manufacturer: YAGEO; Manufacturer Part Number: CC0603JRNPO9BN500; Package Size: 0603; JLCPCB Basic Part: No; JLCPCB Part Number: C576819; Supplier 1: LCSC; Category: Capacitors - MLCC; Supplier Part Number 1: C576819; Tolerance: ±5%; Voltage Rating: 50V; Temperature Coefficient: NP0; RoHS: Yes; ComponentLink1Description: Datasheet; ComponentLink1URL: https://wmsc.lcsc.com/wmsc/upload/file/pdf/v2/lcsc/2208091530_YAGEO-CC0603JRNPO9BN500_C576819.pdf; ComponentLink2Description: JLCPCB Part URL; ComponentLink2URL: https://jlcpcb.com/partdetail/C576819; ComponentLink3Description: LCSC Part URL; ComponentLink3URL: https://lcsc.com/product-detail/Multilayer-Ceramic-Capacitors-MLCC---SMD-SMT_YAGEO-YAGEO-CC0603JRNPO9BN500_C576819.html
footprint CAP-0603 (0603 (1608M) Capacitor)
pins: 1, 2

## CC0603JRNPO9BN501
designator C?  Capacitance: 500pF  (hidden comment: *)
Capacitor, Ceramic (MLCC), 500pF, ±5%, 50V, C0G, ±5%, SMD 0603; Manufacturer: YAGEO; Manufacturer Part Number: CC0603JRNPO9BN501; Package Size: 0603; JLCPCB Basic Part: No; JLCPCB Part Number: C3879676; Supplier 1: LCSC; Category: Capacitors - MLCC; Supplier Part Number 1: C3879676; Tolerance: ±5%; Voltage Rating: 50V; Temperature Coefficient: C0G; RoHS: Yes; ComponentLink1Description: Datasheet; ComponentLink1URL: https://wmsc.lcsc.com/wmsc/upload/file/pdf/v2/lcsc/2311211121_YAGEO-CC0603JRNPO9BN501_C3879676.pdf; ComponentLink2Description: JLCPCB Part URL; ComponentLink2URL: https://jlcpcb.com/partdetail/C3879676; ComponentLink3Description: LCSC Part URL; ComponentLink3URL: https://lcsc.com/product-detail/Multilayer-Ceramic-Capacitors-MLCC---SMD-SMT_YAGEO-YAGEO-CC0603JRNPO9BN501_C3879676.html
footprint CAP-0603 (0603 (1608M) Capacitor)
pins: 1, 2

## CC0603JRNPO9BN510
designator C?  Capacitance: 51pF  (hidden comment: *)
Capacitor, Ceramic (MLCC), 51pF, ±5%, 50V, NP0, ±5%, SMD 0603; Manufacturer: YAGEO; Manufacturer Part Number: CC0603JRNPO9BN510; Package Size: 0603; JLCPCB Basic Part: No; JLCPCB Part Number: C107051; Supplier 1: LCSC; Category: Capacitors - MLCC; Supplier Part Number 1: C107051; Tolerance: ±5%; Voltage Rating: 50V; Temperature Coefficient: NP0; RoHS: Yes; ComponentLink1Description: Datasheet; ComponentLink1URL: https://wmsc.lcsc.com/wmsc/upload/file/pdf/v2/lcsc/2304140030_YAGEO-CC0603JRNPO9BN510_C107051.pdf; ComponentLink2Description: JLCPCB Part URL; ComponentLink2URL: https://jlcpcb.com/partdetail/C107051; ComponentLink3Description: LCSC Part URL; ComponentLink3URL: https://lcsc.com/product-detail/Multilayer-Ceramic-Capacitors-MLCC---SMD-SMT_YAGEO-YAGEO-CC0603JRNPO9BN510_C107051.html
footprint CAP-0603 (0603 (1608M) Capacitor)
pins: 1, 2

## CC0603JRNPO9BN511
designator C?  Capacitance: 510pF  (hidden comment: *)
Capacitor, Ceramic (MLCC), 510pF, ±5%, 50V, NP0, ±5%, SMD 0603; Manufacturer: YAGEO; Manufacturer Part Number: CC0603JRNPO9BN511; Package Size: 0603; JLCPCB Basic Part: No; JLCPCB Part Number: C107052; Supplier 1: LCSC; Category: Capacitors - MLCC; Supplier Part Number 1: C107052; Tolerance: ±5%; Voltage Rating: 50V; Temperature Coefficient: NP0; RoHS: Yes; ComponentLink1Description: Datasheet; ComponentLink1URL: https://wmsc.lcsc.com/wmsc/upload/file/pdf/v2/lcsc/2304140030_YAGEO-CC0603JRNPO9BN511_C107052.pdf; ComponentLink2Description: JLCPCB Part URL; ComponentLink2URL: https://jlcpcb.com/partdetail/C107052; ComponentLink3Description: LCSC Part URL; ComponentLink3URL: https://lcsc.com/product-detail/Multilayer-Ceramic-Capacitors-MLCC---SMD-SMT_YAGEO-YAGEO-CC0603JRNPO9BN511_C107052.html
footprint CAP-0603 (0603 (1608M) Capacitor)
pins: 1, 2

## CC0603JRNPO9BN560
designator C?  Capacitance: 56pF  (hidden comment: *)
Capacitor, Ceramic (MLCC), 56pF, ±5%, 50V, NP0, ±5%, SMD 0603; Manufacturer: YAGEO; Manufacturer Part Number: CC0603JRNPO9BN560; Package Size: 0603; JLCPCB Basic Part: No; JLCPCB Part Number: C107053; Supplier 1: LCSC; Category: Capacitors - MLCC; Supplier Part Number 1: C107053; Tolerance: ±5%; Voltage Rating: 50V; Temperature Coefficient: NP0; RoHS: Yes; ComponentLink1Description: Datasheet; ComponentLink1URL: https://wmsc.lcsc.com/wmsc/upload/file/pdf/v2/lcsc/2111251230_YAGEO-CC0603JRNPO9BN560_C107053.pdf; ComponentLink2Description: JLCPCB Part URL; ComponentLink2URL: https://jlcpcb.com/partdetail/C107053; ComponentLink3Description: LCSC Part URL; ComponentLink3URL: https://lcsc.com/product-detail/Multilayer-Ceramic-Capacitors-MLCC---SMD-SMT_YAGEO-YAGEO-CC0603JRNPO9BN560_C107053.html
footprint CAP-0603 (0603 (1608M) Capacitor)
pins: 1, 2

## CC0603JRNPO9BN561
designator C?  Capacitance: 560pF  (hidden comment: *)
Capacitor, Ceramic (MLCC), 560pF, ±5%, 50V, NP0, ±5%, SMD 0603; Manufacturer: YAGEO; Manufacturer Part Number: CC0603JRNPO9BN561; Package Size: 0603; JLCPCB Basic Part: No; JLCPCB Part Number: C107054; Supplier 1: LCSC; Category: Capacitors - MLCC; Supplier Part Number 1: C107054; Tolerance: ±5%; Voltage Rating: 50V; Temperature Coefficient: NP0; RoHS: Yes; ComponentLink1Description: Datasheet; ComponentLink1URL: https://wmsc.lcsc.com/wmsc/upload/file/pdf/v2/lcsc/2304140030_YAGEO-CC0603JRNPO9BN561_C107054.pdf; ComponentLink2Description: JLCPCB Part URL; ComponentLink2URL: https://jlcpcb.com/partdetail/C107054; ComponentLink3Description: LCSC Part URL; ComponentLink3URL: https://lcsc.com/product-detail/Multilayer-Ceramic-Capacitors-MLCC---SMD-SMT_YAGEO-YAGEO-CC0603JRNPO9BN561_C107054.html
footprint CAP-0603 (0603 (1608M) Capacitor)
pins: 1, 2

## CC0603JRNPO9BN620
designator C?  Capacitance: 62pF  (hidden comment: *)
Capacitor, Ceramic (MLCC), 62pF, ±5%, 50V, NP0, ±5%, SMD 0603; Manufacturer: YAGEO; Manufacturer Part Number: CC0603JRNPO9BN620; Package Size: 0603; JLCPCB Basic Part: No; JLCPCB Part Number: C282073; Supplier 1: LCSC; Category: Capacitors - MLCC; Supplier Part Number 1: C282073; Tolerance: ±5%; Voltage Rating: 50V; Temperature Coefficient: NP0; RoHS: Yes; ComponentLink1Description: Datasheet; ComponentLink1URL: https://wmsc.lcsc.com/wmsc/upload/file/pdf/v2/lcsc/2304140030_YAGEO-CC0603JRNPO9BN620_C282073.pdf; ComponentLink2Description: JLCPCB Part URL; ComponentLink2URL: https://jlcpcb.com/partdetail/C282073; ComponentLink3Description: LCSC Part URL; ComponentLink3URL: https://lcsc.com/product-detail/Multilayer-Ceramic-Capacitors-MLCC---SMD-SMT_YAGEO-YAGEO-CC0603JRNPO9BN620_C282073.html
footprint CAP-0603 (0603 (1608M) Capacitor)
pins: 1, 2

## CC0603JRNPO9BN621
designator C?  Capacitance: 620pF  (hidden comment: *)
Capacitor, Ceramic (MLCC), 620pF, ±5%, 50V, NP0, ±5%, SMD 0603; Manufacturer: YAGEO; Manufacturer Part Number: CC0603JRNPO9BN621; Package Size: 0603; JLCPCB Basic Part: No; JLCPCB Part Number: C325470; Supplier 1: LCSC; Category: Capacitors - MLCC; Supplier Part Number 1: C325470; Tolerance: ±5%; Voltage Rating: 50V; Temperature Coefficient: NP0; RoHS: Yes; ComponentLink1Description: Datasheet; ComponentLink1URL: https://wmsc.lcsc.com/wmsc/upload/file/pdf/v2/lcsc/1912111437_YAGEO-CC0603JRNPO9BN621_C325470.pdf; ComponentLink2Description: JLCPCB Part URL; ComponentLink2URL: https://jlcpcb.com/partdetail/C325470; ComponentLink3Description: LCSC Part URL; ComponentLink3URL: https://lcsc.com/product-detail/Multilayer-Ceramic-Capacitors-MLCC---SMD-SMT_YAGEO-YAGEO-CC0603JRNPO9BN621_C325470.html
footprint CAP-0603 (0603 (1608M) Capacitor)
pins: 1, 2

## CC0603JRNPO9BN680
designator C?  Capacitance: 68pF  (hidden comment: *)
Capacitor, Ceramic (MLCC), 68pF, ±5%, 50V, NP0, ±5%, SMD 0603; Manufacturer: YAGEO; Manufacturer Part Number: CC0603JRNPO9BN680; Package Size: 0603; JLCPCB Basic Part: No; JLCPCB Part Number: C62782; Supplier 1: LCSC; Category: Capacitors - MLCC; Supplier Part Number 1: C62782; Tolerance: ±5%; Voltage Rating: 50V; Temperature Coefficient: NP0; RoHS: Yes; ComponentLink1Description: Datasheet; ComponentLink1URL: https://wmsc.lcsc.com/wmsc/upload/file/pdf/v2/lcsc/2304140030_YAGEO-CC0603JRNPO9BN680_C62782.pdf; ComponentLink2Description: JLCPCB Part URL; ComponentLink2URL: https://jlcpcb.com/partdetail/C62782; ComponentLink3Description: LCSC Part URL; ComponentLink3URL: https://lcsc.com/product-detail/Multilayer-Ceramic-Capacitors-MLCC---SMD-SMT_YAGEO-YAGEO-CC0603JRNPO9BN680_C62782.html
footprint CAP-0603 (0603 (1608M) Capacitor)
pins: 1, 2

## CC0603JRNPO9BN681
designator C?  Capacitance: 680pF  (hidden comment: *)
Capacitor, Ceramic (MLCC), 680pF, ±5%, 50V, NP0, ±5%, SMD 0603; Manufacturer: YAGEO; Manufacturer Part Number: CC0603JRNPO9BN681; Package Size: 0603; JLCPCB Basic Part: No; JLCPCB Part Number: C107055; Supplier 1: LCSC; Category: Capacitors - MLCC; Supplier Part Number 1: C107055; Tolerance: ±5%; Voltage Rating: 50V; Temperature Coefficient: NP0; RoHS: Yes; ComponentLink1Description: Datasheet; ComponentLink1URL: https://wmsc.lcsc.com/wmsc/upload/file/pdf/v2/lcsc/2304140030_YAGEO-CC0603JRNPO9BN681_C107055.pdf; ComponentLink2Description: JLCPCB Part URL; ComponentLink2URL: https://jlcpcb.com/partdetail/C107055; ComponentLink3Description: LCSC Part URL; ComponentLink3URL: https://lcsc.com/product-detail/Multilayer-Ceramic-Capacitors-MLCC---SMD-SMT_YAGEO-YAGEO-CC0603JRNPO9BN681_C107055.html
footprint CAP-0603 (0603 (1608M) Capacitor)
pins: 1, 2

## CC0603JRNPO9BN682
designator C?  Capacitance: 6.8nF  (hidden comment: *)
Capacitor, Ceramic (MLCC), 6.8nF, ±5%, 50V, NP0, ±5%, SMD 0603; Manufacturer: YAGEO; Manufacturer Part Number: CC0603JRNPO9BN682; Package Size: 0603; JLCPCB Basic Part: No; JLCPCB Part Number: C513559; Supplier 1: LCSC; Category: Capacitors - MLCC; Supplier Part Number 1: C513559; Tolerance: ±5%; Voltage Rating: 50V; Temperature Coefficient: NP0; RoHS: Yes; ComponentLink1Description: Datasheet; ComponentLink1URL: https://wmsc.lcsc.com/wmsc/upload/file/pdf/v2/lcsc/2005142147_YAGEO-CC0603JRNPO9BN682_C513559.pdf; ComponentLink2Description: JLCPCB Part URL; ComponentLink2URL: https://jlcpcb.com/partdetail/C513559; ComponentLink3Description: LCSC Part URL; ComponentLink3URL: https://lcsc.com/product-detail/Multilayer-Ceramic-Capacitors-MLCC---SMD-SMT_YAGEO-YAGEO-CC0603JRNPO9BN682_C513559.html
footprint CAP-0603 (0603 (1608M) Capacitor)
pins: 1, 2

## CC0603JRNPO9BN750
designator C?  Capacitance: 75pF  (hidden comment: *)
Capacitor, Ceramic (MLCC), 75pF, ±5%, 50V, NP0, ±5%, SMD 0603; Manufacturer: YAGEO; Manufacturer Part Number: CC0603JRNPO9BN750; Package Size: 0603; JLCPCB Basic Part: No; JLCPCB Part Number: C282074; Supplier 1: LCSC; Category: Capacitors - MLCC; Supplier Part Number 1: C282074; Tolerance: ±5%; Voltage Rating: 50V; Temperature Coefficient: NP0; RoHS: Yes; ComponentLink1Description: Datasheet; ComponentLink1URL: https://wmsc.lcsc.com/wmsc/upload/file/pdf/v2/lcsc/2304140030_YAGEO-CC0603JRNPO9BN750_C282074.pdf; ComponentLink2Description: JLCPCB Part URL; ComponentLink2URL: https://jlcpcb.com/partdetail/C282074; ComponentLink3Description: LCSC Part URL; ComponentLink3URL: https://lcsc.com/product-detail/Multilayer-Ceramic-Capacitors-MLCC---SMD-SMT_YAGEO-YAGEO-CC0603JRNPO9BN750_C282074.html
footprint CAP-0603 (0603 (1608M) Capacitor)
pins: 1, 2

## CC0603JRNPO9BN751
designator C?  Capacitance: 750pF  (hidden comment: *)
Capacitor, Ceramic (MLCC), 750pF, ±5%, 50V, NP0, ±5%, SMD 0603; Manufacturer: YAGEO; Manufacturer Part Number: CC0603JRNPO9BN751; Package Size: 0603; JLCPCB Basic Part: No; JLCPCB Part Number: C113798; Supplier 1: LCSC; Category: Capacitors - MLCC; Supplier Part Number 1: C113798; Tolerance: ±5%; Voltage Rating: 50V; Temperature Coefficient: NP0; RoHS: Yes; ComponentLink1Description: Datasheet; ComponentLink1URL: https://wmsc.lcsc.com/wmsc/upload/file/pdf/v2/lcsc/2304140030_YAGEO-CC0603JRNPO9BN751_C113798.pdf; ComponentLink2Description: JLCPCB Part URL; ComponentLink2URL: https://jlcpcb.com/partdetail/C113798; ComponentLink3Description: LCSC Part URL; ComponentLink3URL: https://lcsc.com/product-detail/Multilayer-Ceramic-Capacitors-MLCC---SMD-SMT_YAGEO-YAGEO-CC0603JRNPO9BN751_C113798.html
footprint CAP-0603 (0603 (1608M) Capacitor)
pins: 1, 2

## CC0603JRNPO9BN820
designator C?  Capacitance: 82pF  (hidden comment: *)
Capacitor, Ceramic (MLCC), 82pF, ±5%, 50V, NP0, ±5%, SMD 0603; Manufacturer: YAGEO; Manufacturer Part Number: CC0603JRNPO9BN820; Package Size: 0603; JLCPCB Basic Part: No; JLCPCB Part Number: C107056; Supplier 1: LCSC; Category: Capacitors - MLCC; Supplier Part Number 1: C107056; Tolerance: ±5%; Voltage Rating: 50V; Temperature Coefficient: NP0; RoHS: Yes; ComponentLink1Description: Datasheet; ComponentLink1URL: https://wmsc.lcsc.com/wmsc/upload/file/pdf/v2/lcsc/2304140030_YAGEO-CC0603JRNPO9BN820_C107056.pdf; ComponentLink2Description: JLCPCB Part URL; ComponentLink2URL: https://jlcpcb.com/partdetail/C107056; ComponentLink3Description: LCSC Part URL; ComponentLink3URL: https://lcsc.com/product-detail/Multilayer-Ceramic-Capacitors-MLCC---SMD-SMT_YAGEO-YAGEO-CC0603JRNPO9BN820_C107056.html
footprint CAP-0603 (0603 (1608M) Capacitor)
pins: 1, 2

## CC0603JRNPO9BN821
designator C?  Capacitance: 820pF  (hidden comment: *)
Capacitor, Ceramic (MLCC), 820pF, ±5%, 50V, NP0, ±5%, SMD 0603; Manufacturer: YAGEO; Manufacturer Part Number: CC0603JRNPO9BN821; Package Size: 0603; JLCPCB Basic Part: No; JLCPCB Part Number: C107057; Supplier 1: LCSC; Category: Capacitors - MLCC; Supplier Part Number 1: C107057; Tolerance: ±5%; Voltage Rating: 50V; Temperature Coefficient: NP0; RoHS: Yes; ComponentLink1Description: Datasheet; ComponentLink1URL: https://wmsc.lcsc.com/wmsc/upload/file/pdf/v2/lcsc/2304140030_YAGEO-CC0603JRNPO9BN821_C107057.pdf; ComponentLink2Description: JLCPCB Part URL; ComponentLink2URL: https://jlcpcb.com/partdetail/C107057; ComponentLink3Description: LCSC Part URL; ComponentLink3URL: https://lcsc.com/product-detail/Multilayer-Ceramic-Capacitors-MLCC---SMD-SMT_YAGEO-YAGEO-CC0603JRNPO9BN821_C107057.html
footprint CAP-0603 (0603 (1608M) Capacitor)
pins: 1, 2

## CC0603JRNPO9BN910
designator C?  Capacitance: 91pF  (hidden comment: *)
Capacitor, Ceramic (MLCC), 91pF, ±5%, 50V, NP0, ±5%, SMD 0603; Manufacturer: YAGEO; Manufacturer Part Number: CC0603JRNPO9BN910; Package Size: 0603; JLCPCB Basic Part: No; JLCPCB Part Number: C282075; Supplier 1: LCSC; Category: Capacitors - MLCC; Supplier Part Number 1: C282075; Tolerance: ±5%; Voltage Rating: 50V; Temperature Coefficient: NP0; RoHS: Yes; ComponentLink1Description: Datasheet; ComponentLink1URL: https://wmsc.lcsc.com/wmsc/upload/file/pdf/v2/lcsc/2304140030_YAGEO-CC0603JRNPO9BN910_C282075.pdf; ComponentLink2Description: JLCPCB Part URL; ComponentLink2URL: https://jlcpcb.com/partdetail/C282075; ComponentLink3Description: LCSC Part URL; ComponentLink3URL: https://lcsc.com/product-detail/Multilayer-Ceramic-Capacitors-MLCC---SMD-SMT_YAGEO-YAGEO-CC0603JRNPO9BN910_C282075.html
footprint CAP-0603 (0603 (1608M) Capacitor)
pins: 1, 2

## CC0603JRNPOABN100
designator C?  Capacitance: 10pF  (hidden comment: *)
Capacitor, Ceramic (MLCC), 10pF, ±5%, 200V, NP0, ±5%, SMD 0603; Manufacturer: YAGEO; Manufacturer Part Number: CC0603JRNPOABN100; Package Size: 0603; JLCPCB Basic Part: No; JLCPCB Part Number: C576820; Supplier 1: LCSC; Category: Capacitors - MLCC; Supplier Part Number 1: C576820; Tolerance: ±5%; Voltage Rating: 200V; Temperature Coefficient: NP0; RoHS: Yes; ComponentLink1Description: Datasheet; ComponentLink1URL: https://wmsc.lcsc.com/wmsc/upload/file/pdf/v2/lcsc/2007201010_YAGEO-CC0603JRNPOABN100_C576820.pdf; ComponentLink2Description: JLCPCB Part URL; ComponentLink2URL: https://jlcpcb.com/partdetail/C576820; ComponentLink3Description: LCSC Part URL; ComponentLink3URL: https://lcsc.com/product-detail/Multilayer-Ceramic-Capacitors-MLCC---SMD-SMT_YAGEO-YAGEO-CC0603JRNPOABN100_C576820.html
footprint CAP-0603 (0603 (1608M) Capacitor)
pins: 1, 2

## CC0603JRNPOABN101
designator C?  Capacitance: 100pF  (hidden comment: *)
Capacitor, Ceramic (MLCC), 100pF, ±5%, 200V, NP0, ±5%, SMD 0603; Manufacturer: YAGEO; Manufacturer Part Number: CC0603JRNPOABN101; Package Size: 0603; JLCPCB Basic Part: No; JLCPCB Part Number: C576821; Supplier 1: LCSC; Category: Capacitors - MLCC; Supplier Part Number 1: C576821; Tolerance: ±5%; Voltage Rating: 200V; Temperature Coefficient: NP0; RoHS: Yes; ComponentLink1Description: Datasheet; ComponentLink1URL: https://wmsc.lcsc.com/wmsc/upload/file/pdf/v2/lcsc/2006091814_YAGEO-CC0603JRNPOABN101_C576821.pdf; ComponentLink2Description: JLCPCB Part URL; ComponentLink2URL: https://jlcpcb.com/partdetail/C576821; ComponentLink3Description: LCSC Part URL; ComponentLink3URL: https://lcsc.com/product-detail/Multilayer-Ceramic-Capacitors-MLCC---SMD-SMT_YAGEO-YAGEO-CC0603JRNPOABN101_C576821.html
footprint CAP-0603 (0603 (1608M) Capacitor)
pins: 1, 2